# Altium footprint library NDLib.PCBLIB: 499 footprints (part 31 of 32)
Each footprint in its own frame and in the unit in brackets; x right, y up, seen from the top. Pads: shape width x height; smd on the part's side, far side on the other; paste and mask are expansions set on the pad; w line width, h text height; cw(c..) or ccw(c..) is an arc to the next point about the centre after c.
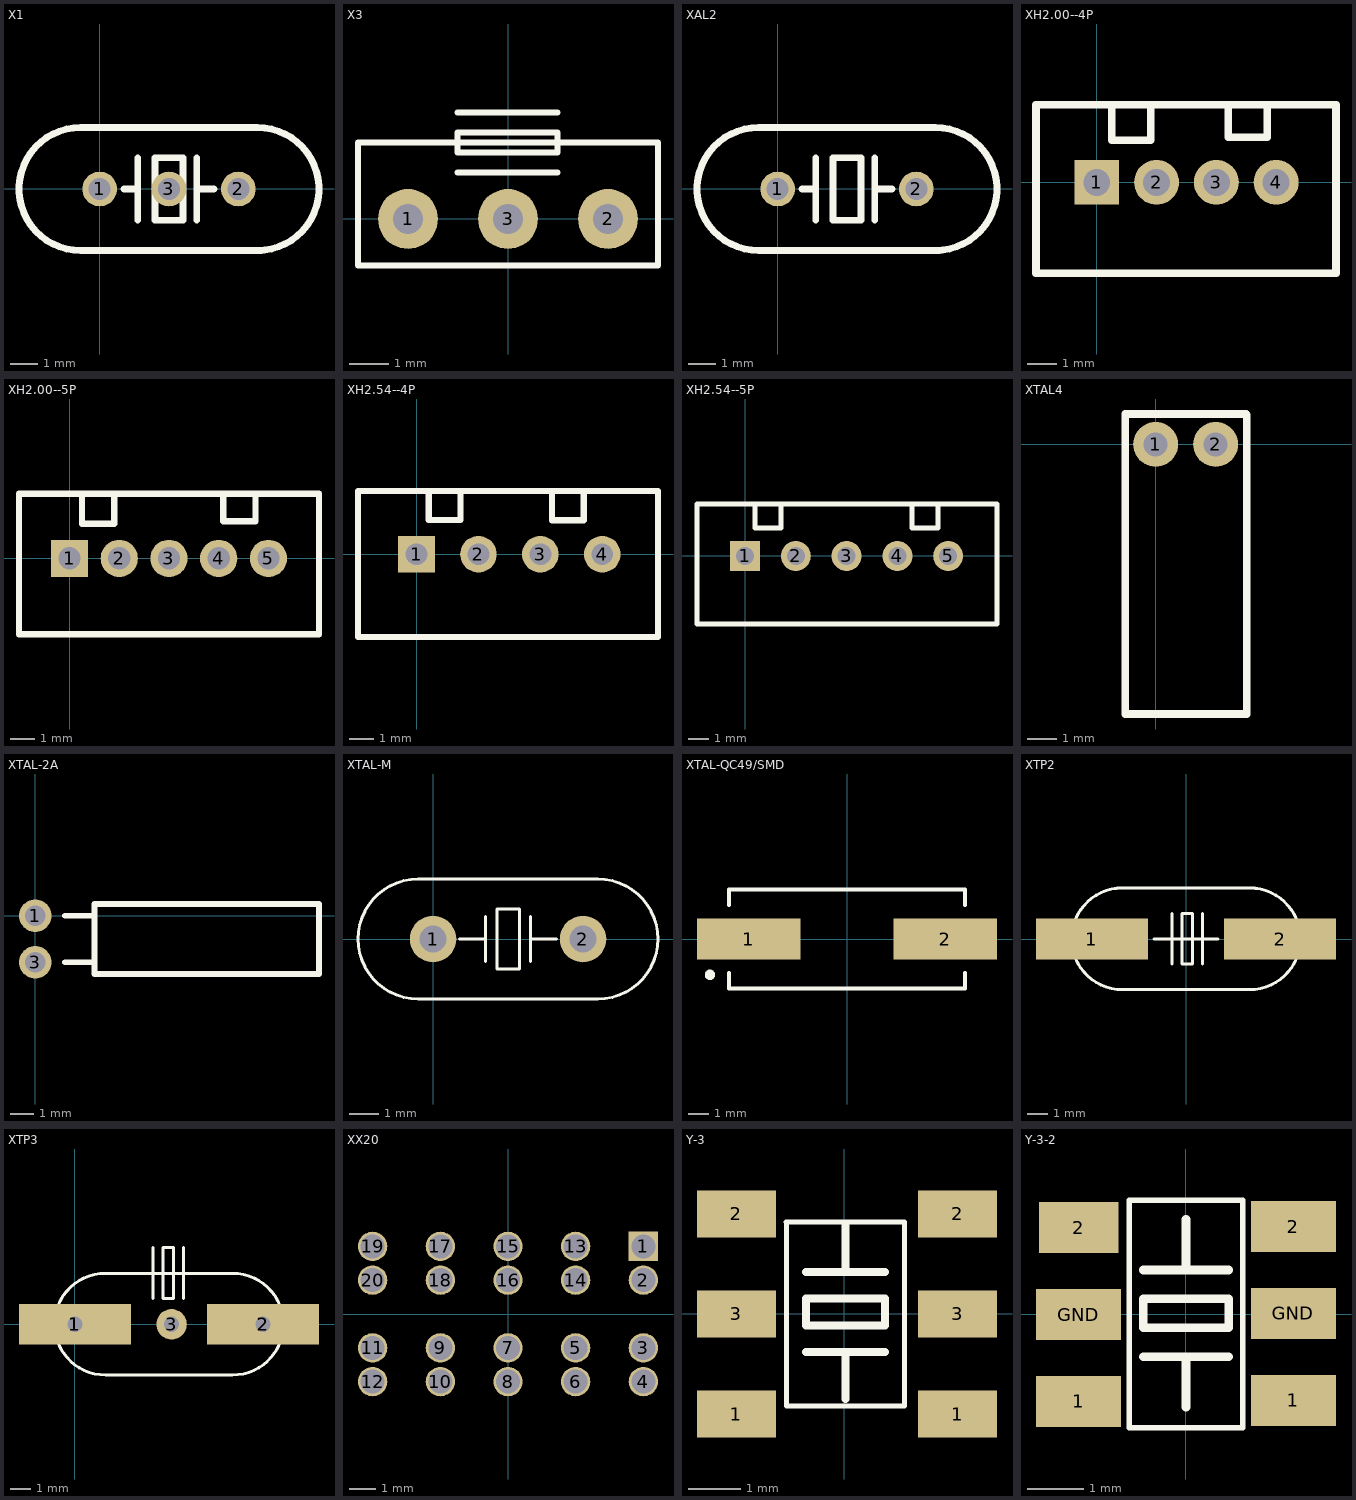
[diagram p30: the footprints below, top view; thin cyan lines are the x and y axes]

## X1 [mil]
pads (3):
  round 50 / inner round 50 / far side round 78.74 hole 32: 1(0,0) 2(200,0) 3(100,0)
TopOverlay:
  lines w10: 35,0 55,0 ; 55,-45 55,45 ; 140,-45 140,45 ; 140,0 165,0 ; 227.56,-88.58 ccw(c227.56,0) 227.56,88.58 -27.56,88.58 ccw(c-27.56,0) -27.56,-88.58 233.58,-88.58 ; 80,-45 80,45 120,45 120,-45 80,-45

## X3 [mil]
height 157.48
pads (3):
  round 60 hole 30: 1(-100,0) 2(100,0) 3(0,0)
TopOverlay:
  lines w6: -150,-46.73 -150,0 -150,76.72 ; -149.31,-46.73 150,-46.73 150,0 150,76.72 -149.31,76.72 ; -50.61,46.7 49.39,46.7 ; -50.61,106.7 49.39,106.7 ; -50.61,66.7 49.39,66.7 49.39,86.7 -50.61,86.7 -50.61,66.7

## XAL2 [mil]
pads (2):
  round 50 / inner round 50 / far side round 78.74 hole 32: 1(0,0) 2(200,0)
TopOverlay:
  lines w10: 35,0 55,0 ; 55,-45 55,45 ; 140,-45 140,45 ; 140,0 165,0 ; 227.56,-88.58 ccw(c227.56,0) 227.56,88.58 -27.56,88.58 ccw(c-27.56,0) -27.56,-88.58 233.58,-88.58 ; 80,-45 120,-45 120,45 80,45 80,-45
3D body: height 137.8, standoff -157.48, extent -123.43,-94.49 323.43,88.58

## XH2.00--4P [mm]
pads (4):
  rect 1.5x1.5 hole 0.9: 1(0,0)
  round 1.5 hole 0.9: 2(2,0) 3(4,0) 4(6,0)
TopOverlay:
  lines w0.254: 0.5,2.5 0.5,1.4 1.8,1.4 1.8,2.5 ; 4.4,2.6 4.4,1.5 5.7,1.5 5.7,2.6 ; -2.032,-3.048 8.001,-3.048 8.001,2.6 -2.032,2.6 -2.032,-3.048

## XH2.00--5P [mm]
pads (5):
  rect 1.5x1.5 hole 0.9: 1(0,0)
  round 1.5 hole 0.9: 2(2,0) 3(4,0) 4(6,0) 5(8,0)
TopOverlay:
  lines w0.254: 0.5,2.5 0.5,1.4 1.8,1.4 1.8,2.5 ; 6.178,2.6 6.178,1.5 7.478,1.5 7.478,2.6 ; -2.032,-3.048 10.033,-3.048 10.033,2.6 -2.032,2.6 -2.032,-3.048
BottomOverlay:
  lines w0.254: -0.114,0 0,0

## XH2.54--4P [mm]
pads (4):
  rect 1.5x1.5 hole 0.9: 1(0,0)
  round 1.5 hole 0.9: 2(2.54,0) 3(5.08,0) 4(7.62,0)
TopOverlay:
  lines w0.254: 0.5,2.5 0.5,1.4 1.8,1.4 1.8,2.5 ; 5.558,2.498 5.558,1.398 6.858,1.398 6.858,2.498 ; -2.4,-3.4 -2.4,2.6 9.906,2.6 9.906,-3.4 -2.4,-3.4

## XH2.54--5P [mm]
pads (5):
  rect 1.5x1.5 hole 0.9: 1(0,0)
  round 1.5 hole 0.9: 2(2.54,0) 3(5.08,0) 4(7.62,0) 5(10.16,0)
TopOverlay:
  lines w0.254: 0.5,2.5 0.5,1.4 1.8,1.4 1.8,2.5 ; 8.352,2.498 8.352,1.398 9.652,1.398 9.652,2.498 ; -2.4,-3.4 -2.4,2.6 12.6,2.6 12.6,-3.4 -2.4,-3.4

## XTAL4 [mm]
pads (2):
  round 1.5 hole 0.8: 1(0,0) 2(2.007,0)
TopOverlay:
  lines w0.254: 3.023,1.016 -1.016,1.016 -1.016,-9.017 3.048,-9.017 3.048,0.991

## XTAL-2A [mil]
pads (2):
  round 55 hole 35: 1(0,0) 3(0,-78.74)
TopOverlay:
  lines w10: 50,-78.74 100,-78.74 ; 50,0 100,0 ; 100,-98.43 480,-98.43 480,19.68 100,19.68 100,-98.43

## XTAL-M [mil]
pads (2):
  round 62 hole 35.43: 1(0,0) 2(200,0)
TopOverlay:
  lines w4: 35,0 70,0 ; 70,-30 70,30 ; 130,-30 130,30 ; 130,0 165,0 ; -20,-80 cw(c-20,0) -20,80 220,80 cw(c220,0) 220,-80 -20,-80 ; 85,-40 115,-40 115,40 85,40 85,-40

## XTAL-QC49/SMD [mm]
pads (2):
  rect 5x2 smd: 1(-4.75,0) 2(4.75,0)
TopOverlay:
  circle w0.25: c-6.625,-1.73 r0.125
  lines w0.2: -5.7,-1.65 -5.7,-2.4 5.7,-2.4 5.7,-1.65 ; -5.7,1.65 -5.7,2.4 5.7,2.4 5.7,1.65
3D body: height 4, standoff 0, extent -6.7,-2.462 6.7,2.438

## XTP2 [mil]
height 196.85
pads (2):
  rect 220x80 smd: 1(-185,0) 2(185,0)
TopOverlay:
  lines w6: -66.55,100.39 -31.55,100.39 ; -62.5,0.39 62.5,0.39 ; -27.5,-49.61 -27.5,50.39 ; 28.45,100.39 63.45,100.39 ; 32.5,-49.61 32.5,50.39 ; -125,-99.61 cw(c-125,0.39) -125,100.39 125,100.39 cw(c125,0.39) 125,-99.61 -125,-99.61 ; -7.5,-49.61 12.5,-49.61 12.5,50.39 -7.5,50.39 -7.5,-49.61

## XTP3 [mil]
pads (5):
  rect 220x80 smd: 1(0,0) 2(370,0)
  round 60 hole 30: 1(0,0) 2(370,0) 3(190,0)
TopOverlay:
  lines w6: 118.45,100.39 153.45,100.39 ; 153.45,50.79 153.45,150.79 ; 213.45,50.79 213.45,150.79 ; 213.45,100.39 248.45,100.39 ; 60,-99.61 cw(c60,0.39) 60,100.39 310,100.39 cw(c310,0.39) 310,-99.61 60,-99.61 ; 173.45,50.79 173.45,150.79 193.45,150.79 193.45,50.79 173.45,50.79

## XX20 [mm]
pads (20):
  rect 1.1x1.1 / inner rect 1.5x1.5 / far side rect 1.5x1.5 hole 0.9: 1(5.08,2.54)
  round 1.1 / inner round 1.5 / far side round 1.5 hole 0.9: 2(5.08,1.27) 3(5.08,-1.27) 4(5.08,-2.54) 5(2.54,-1.27) 6(2.54,-2.54) 7(0,-1.27) 8(0,-2.54) 9(-2.54,-1.27) 10(-2.54,-2.54) 11(-5.08,-1.27) 12(-5.08,-2.54) 13(2.54,2.54) 14(2.54,1.27) 15(0,2.54) 16(0,1.27) 17(-2.54,2.54) 18(-2.54,1.27) 19(-5.08,2.54) 20(-5.08,1.27)

## Y-3 [mm]
height 2
pads (6):
  rect 1.5x0.9 smd: 1(-2.05,-1.9) 1(2.15,-1.9) 2(-2.05,1.9) 2(2.15,1.9) 3(-2.05,0) 3(2.15,0)
TopOverlay:
  lines w0.1: -1.111,1.75 1.141,1.75 1.141,-1.75 -1.1,-1.75 -1.1,1.739 -1.111,1.75
  lines w0.152: -0.725,-0.722 0.775,-0.722 ; -0.725,0.802 0.775,0.802 ; 0.025,-1.611 0.025,-0.722 ; 0.025,0.802 0.025,1.691 ; -0.725,-0.214 -0.725,0.294 0.775,0.294 0.775,-0.214 -0.725,-0.214

## Y-3-2 [mm]
height 2
pads (6):
  rect 1.5x0.9 smd: 1(-1.89,-1.54) 1(1.89,-1.52) 2(1.89,1.54) GND(-1.89,-0.01) GND(1.89,0.01)
  rect 1.4x0.9 smd: 2(-1.89,1.52)
TopOverlay:
  lines w0.1: -1,-2 1,-2 1,2 -1,2 -1,-2
  lines w0.152: -0.75,-0.75 0.75,-0.75 ; -0.75,0.774 0.75,0.774 ; 0,-1.639 0,-0.75 ; 0,0.774 0,1.663 ; -0.75,-0.242 0.75,-0.242 0.75,0.266 -0.75,0.266 -0.75,-0.242